# Altium footprint library mmyLibrary.PcbLib: 231 footprints (part 14 of 15)
Each footprint in its own frame and in the unit in brackets; x right, y up, seen from the top. Pads: shape width x height; smd on the part's side, far side on the other; paste and mask are expansions set on the pad; w line width, h text height; cw(c..) or ccw(c..) is an arc to the next point about the centre after c.
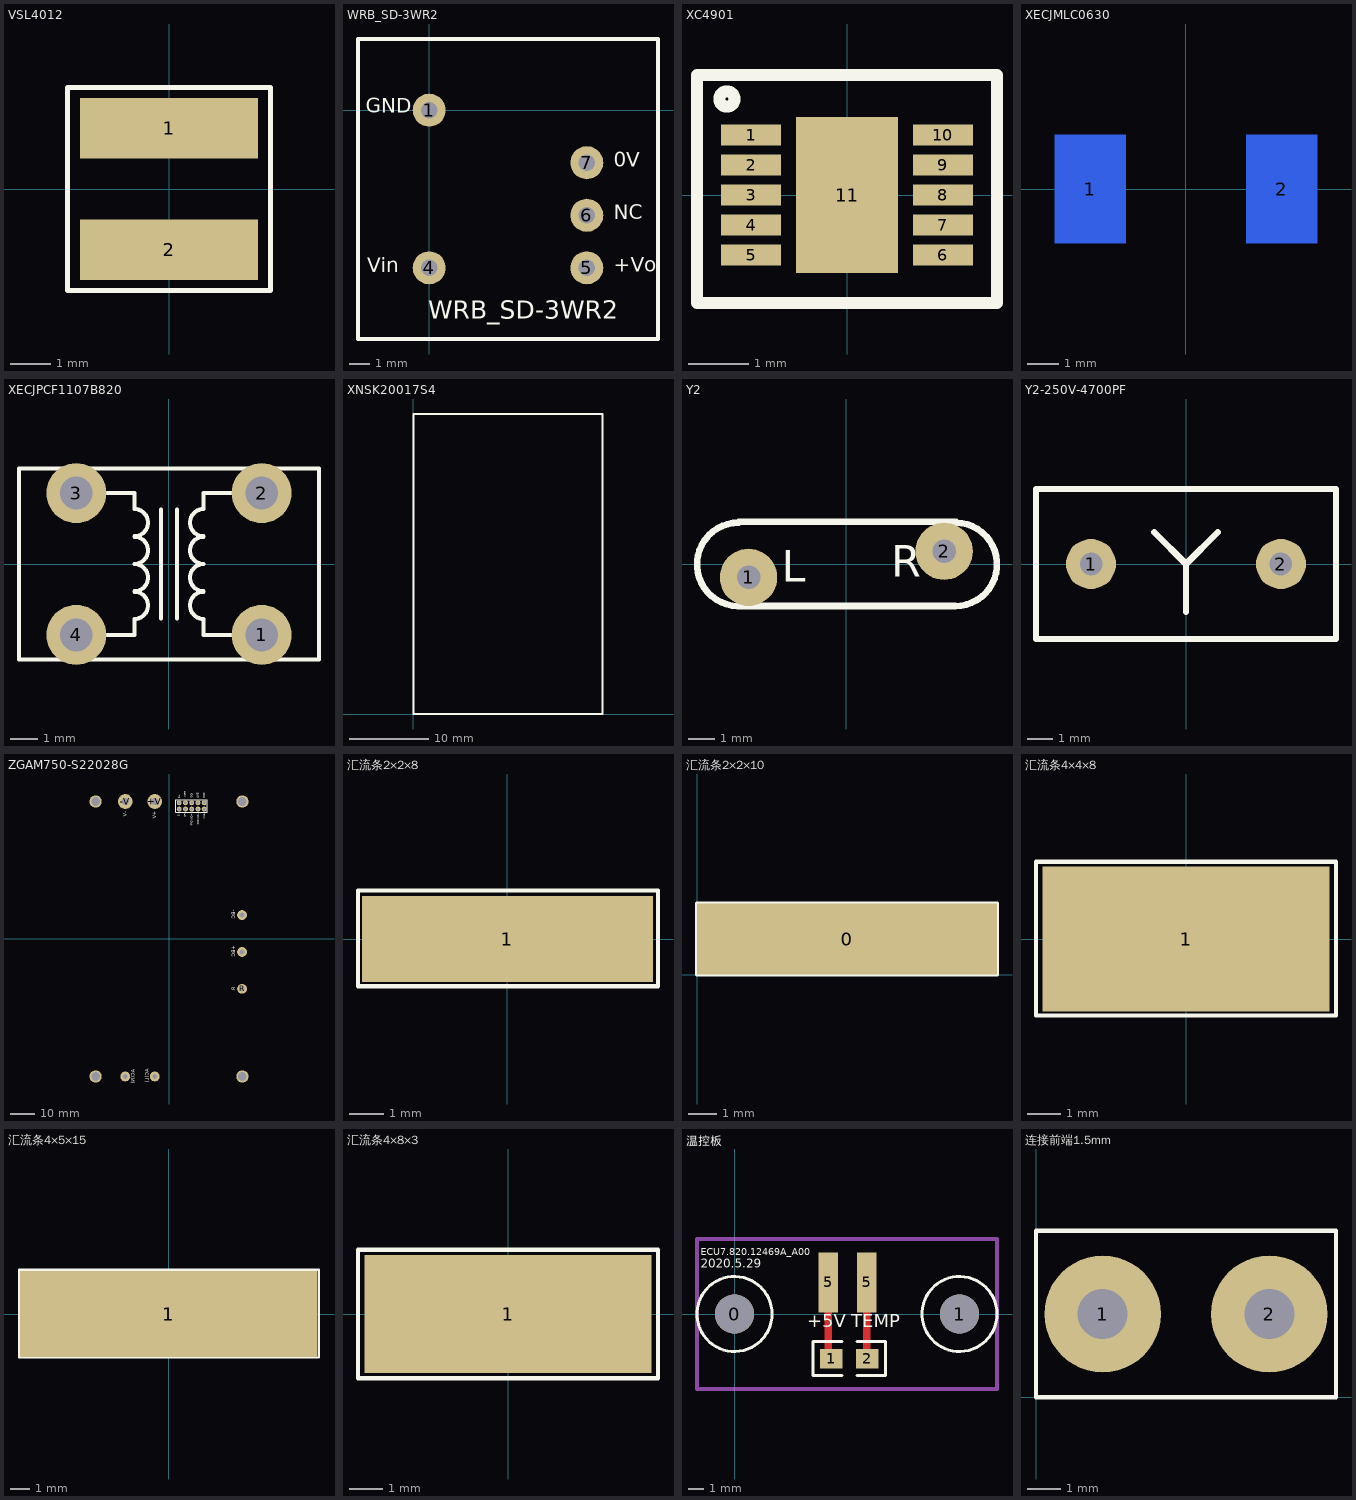
[diagram p13: the footprints below, top view; thin cyan lines are the x and y axes]

## VSL4012 [mm]
pads (2):
  rect 4.4x1.5 smd: 1(0,1.5) 2(0,-1.5)
Top Overlay:
  lines w0.12: -2.5,-2.5 2.5,-2.5 2.5,2.5 -2.5,2.5 -2.5,-2.5
3D body "Coilcraft-LPS4012.STEP": height 1.2, standoff 0, extent -1.99,-2.117 1.99,1.863

## WRB_SD-3WR2 [mm] "金升阳"
pads (5):
  round 1.6 hole 0.8: 1(0,0) 4(0,-7.62) 5(7.62,-7.62) 6(7.62,-5.08) 7(7.62,-2.54)
Top Overlay:
  lines w0.17: -3.44,-11.06 -3.44,3.44 11.06,3.44 11.06,-11.06 -3.44,-11.06
  text "WRB_SD-3WR2" at -0.05,-10.361 h1.5
  text "GND" at -3.057,-0.373 h1.2
  text "Vin" at -2.986,-8.085 h1.2
  text "0V" at 8.924,-2.983 h1.2
  text "NC" at 8.926,-5.522 h1.2
  text "+Vo" at 8.926,-8.061 h1.2
3D body "WRB_SD-1WR2.stp": height 9.2, standoff -2.9, extent -3.19,-10.81 10.81,3.19

## XC4901 [mm]
pads (11):
  rect 1x0.35 smd: 1(-1.6,1) 2(-1.6,0.5) 3(-1.6,0) 4(-1.6,-0.5) 5(-1.6,-1) 6(1.6,-1) 7(1.6,-0.5) 8(1.6,0) 9(1.6,0.5) 10(1.6,1)
  rect 1.7x2.6 smd: 11(0,0)
Top Overlay:
  circle w0.2: c-2,1.6 r0.127
  lines w0.2: -2.5,-1.8 -2.5,2 2.5,2 2.5,-1.8 -2.5,-1.8

## XECJMLC0630 [mm]
pads (2):
  rect 2.3x3.5 smd far side: 1(-3.1,0) 2(3.1,0)
Bottom Overlay:
  lines w0.254: -3.7,-3.4 3.6,-3.4 3.6,3.4 -3.7,3.4 -3.7,-3.4

## XECJPCF1107B820 [mm]
pads (4):
  round 2.2 hole 1.2: 1(3.4,-2.6) 2(3.4,2.6) 4(-3.4,-2.6)
  round 2.2 hole 1.2 paste+0: 3(-3.4,2.6)
Top Overlay:
  lines w0.15: -3.4,-2.6 -1.27,-2.6 -1.27,-2.016 ccw(c-1.27,-1.516) -1.27,-1.016 ; -3.4,2.6 -1.27,2.6 -1.27,2.016 cw(c-1.27,1.516) -1.27,1.016 ; -1.27,-1 ccw(c-1.27,-0.5) -1.27,0 ccw(c-1.27,0.5) -1.27,1 ; -0.3,-2 -0.3,2 ; 0.3,-2 0.3,2 ; 1.27,-1.016 ccw(c1.27,-1.516) 1.27,-2.016 1.27,-2.6 3.4,-2.6 ; 1.27,-1 cw(c1.27,-0.5) 1.27,0 cw(c1.27,0.5) 1.27,1 ; 1.27,1.016 cw(c1.27,1.516) 1.27,2.016 1.27,2.6 3.4,2.6 ; -5.5,-3.5 5.5,-3.5 5.5,3.5 -5.5,3.5 -5.5,-3.5

## XNSK20017S4 [mm]
Top Overlay:
  lines w0.254: 0,0 0,38 24,38 24,0 0,0

## Y2 [mm]
pads (2):
  round 2.2 hole 0.9: 1(-3.75,-0.5) 2(3.75,0.5)
Top Overlay:
  lines w0.254: -4.125,1.6 ccw(c-4.125,0) -4.155,-1.6 4.175,-1.6 ccw(c4.175,0) 4.205,1.6 ; -4.125,1.625 4.205,1.625
  text "R" at 1.72,-0.48 h1.2
  text "L" at -2.48,-0.67 h1.2

## Y2-250V-4700PF [mm]
pads (2):
  round 2 hole 0.9: 1(-3.8,0) 2(3.8,0)
Top Overlay:
  lines w0.254: -1.27,1.27 0,0 ; 0,-1.905 0,0 ; 1.27,1.27 0,0 ; -6,-3 -6,3 6,3 6,-3 -6,-3

## ZGAM750-S22028G [mm] "L122mm*W70mm*H12.7mm 中兴"
height 12.7
pads (21):
  round 4 hole 2: +BC(29.73,-5.26) -BC(29.73,9.74) ACL(-5.78,-55.9) ACN(-17.78,-55.9) R(29.73,-20.26)
  round 2 hole 1: +ON/OFF(9.23,52.85) +S(4.15,55.39) -ON/OFF(11.77,52.85) -S(4.15,52.85) AUX(14.31,52.85) COM(14.31,55.39) ENA(11.77,55.39) IOG(9.23,55.39) PC(6.69,52.85) TRIM(6.69,55.39)
  round 6 hole 3: +V(-5.78,55.9) -V(-17.78,55.9)
  round 5 hole 3.5: ""(-29.85,-55.9) ""(-29.85,55.9) ""(29.85,-55.9) ""(29.85,55.9)
Top Overlay:
  lines w0.2: 2.81,51.55 15.61,51.55 15.61,56.65 2.81,56.65 2.81,51.55
  text "+S" at 4.5,58.7 h0.8
  text "ENA" at 12.2,59.4 h0.8
  text "IOG" at 9.7,59.3 h0.8
  text "TRIM" at 7,60 h0.8
  text "COM" at 14.8,59.4 h0.8
  text "-BC" at 27,11.8 h1.5
  text "+BC" at 26.9,-2.8 h1.5
  text "R" at 26.9,-19.6 h1.5
  text "AC(L)" at -8.15,-52.8 h1.5
  text "AC(N)" at -13.85,-52.9 h1.5
  text "+V" at -5.1,51.9 h1.5
  text "-V" at -17.1,51.9 h1.5
  text "-S" at 4.4,51 h0.8
  text "-ON/OFF" at 12.22,51 h0.8
  text "+ON/OFF" at 9.7,51 h0.8
  text "PC" at 7,51 h0.8
  text "AUX" at 14.8,51 h0.8
Bottom Overlay:
  lines w0.2: -35,-61 -35,61 35,61 35,-61 -35,-61
  text "COM" at 14.8,57.3 h0.8
  text "+S" at 4.5,57.25 h0.8
  text "IOG" at 9.7,57.3 h0.8
  text "ENA" at 12.3,57.3 h0.8
  text "TRIM" at 7,57.25 h0.8
  text "AUX" at 14.8,48.8 h0.8
  text "-BC" at 27,7.6 h1.5
  text "+BC" at 27,-7.2 h1.5
  text "AC(L)" at -8.15,-59.1 h1.5
  text "AC(N)" at -13.85,-59.2 h1.5
  text "R" at 27,-20.6 h1.5
  text "+V" at -5,49 h1.5
  text "-V" at -17,49 h1.5
  text "-S" at 4.5,49.6 h0.8
  text "+ON/OFF" at 9.7,45.7 h0.8
  text "-ON/OFF" at 12.3,45.7 h0.8
  text "PC" at 7,49.6 h0.8

## 汇流条2×2×8 [mm]
pads (1):
  rect 8.5x2.5 smd: 1(0,0)
Top Overlay:
  lines w0.127: -4.361,-1.377 4.402,-1.377 4.402,1.25 4.402,1.417 -4.361,1.417 -4.361,-1.377

## 汇流条2×2×10 [mm] "2mm*2mm*10mm"
height 2
pads (1):
  rect 10.5x2.5 smd: 0(5.25,1.25)
Top Overlay:
  lines w0.127: 0,0 0,2.5 10.5,2.5 10.5,0 0,0

## 汇流条4×4×8 [mm]
pads (1):
  rect 8.5x4.3 smd: 1(0,0)
Top Overlay:
  lines w0.127: -4.445,-2.266 -1.059,-2.266 4.445,-2.266 4.445,2.286 -4.445,2.286 -4.445,-2.266

## 汇流条4×5×15 [mm]
height 5
pads (1):
  rect 15.5x4.5 smd: 1(0,0)
Top Overlay:
  lines w0.127: -7.79,-2.266 -1.059,-2.266 7.831,-2.266 7.831,2.306 -7.79,2.306 -7.79,-2.266

## 汇流条4×8×3 [mm] "2.75.72.0197"
pads (1):
  rect 8.5x3.5 smd: 1(0,0)
Top Overlay:
  lines w0.127: -4.445,-1.905 -0.698,-1.905 4.445,-1.905 4.445,1.905 -4.445,1.905 -4.445,-1.905

## 温控板 [mm]
pads (6):
  round 2.6 hole 2.6: 0(0,0) 1(15,0)
  rect 1.5x1.3 smd: 1(6.46,-2.968) 2(8.86,-2.968)
  rect 1.3x4 smd: 5(6.263,2.112) 5(8.803,2.112)
Top Layer:
  lines w0.5: 6.263,2.112 6.263,-2.771 6.46,-2.968 ; 8.803,-2.911 8.803,2.112
Top Overlay:
  circle w0.2: c0,0 r2.5
  circle w0.2: c15,0 r2.5
  lines w0.2: 7.152,-4.111 5.247,-4.111 5.247,-1.825 7.152,-1.825 ; 8.168,-4.111 10.073,-4.111 10.073,-1.825 8.168,-1.825
  text "2020.5.29" at -2.246,2.874 h1
  text "ECU7.820.12469A_A00" at -2.246,3.763 h0.8
  text "+5V" at 4.866,-1.19 h1.5
  text "TEMP" at 7.787,-1.19 h1.5
Mechanical 4:
  lines w0.3: -2.5,-5 -2.5,5 17.5,5 17.5,-5 -2.5,-5

## 连接前端1.5mm [mm] "孔径1.5mm"
pads (2):
  round 3.5 hole 1.5: 1(2,2.5) 2(7,2.5)
Top Overlay:
  lines w0.127: 0,0 0,5 9,5 9,0 0,0